# Altium footprint library ic.PcbLib: 114 footprints (part 7 of 8)
Each footprint in its own frame and in the unit in brackets; x right, y up, seen from the top. Pads: shape width x height; smd on the part's side, far side on the other; paste and mask are expansions set on the pad; w line width, h text height; cw(c..) or ccw(c..) is an arc to the next point about the centre after c.
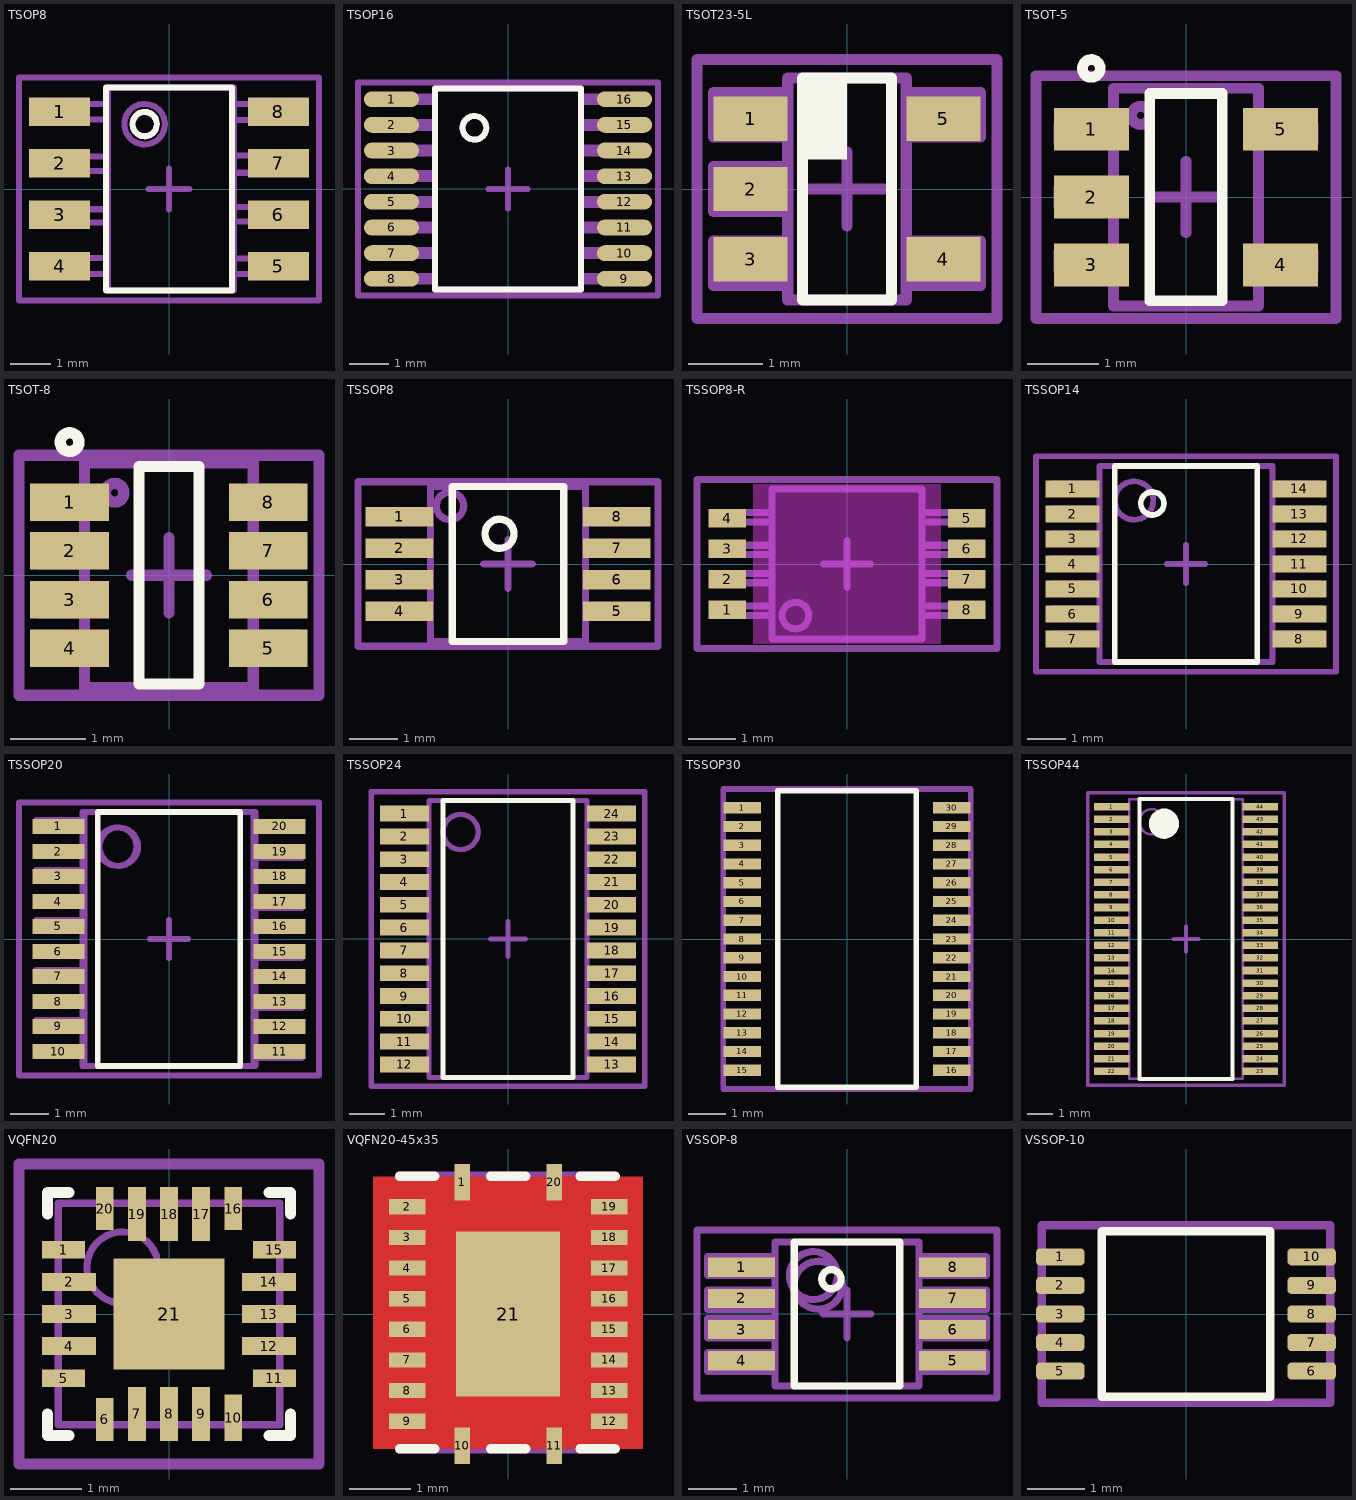
[diagram p6: the footprints below, top view; thin cyan lines are the x and y axes]

## TSOP8 [mm] "8-Lead Plastic Small Outline, Body 4,90x3,85mm, Pitch 1,27mm, IPC Medium Density"
height 1.36
pads (8):
  rect 1.5x0.7 smd: 1(-2.7,1.905) 2(-2.7,0.635) 3(-2.7,-0.635) 4(-2.7,-1.905) 5(2.7,-1.905) 6(2.7,-0.635) 7(2.7,0.635) 8(2.7,1.905)
Top Overlay:
  circle w0.15: c-0.6,1.6 r0.3
  lines w0.15: -1.55,-2.5 1.55,-2.5 1.55,2.5 -1.55,2.5 -1.55,-2.5
  text "." at -2.7,2.8 h0.1
Top Courtyard:
  lines w0.15: -0.5,0 0.5,0 ; 0,-0.5 0,0.5 ; -3.7,-2.75 3.7,-2.75 3.7,2.75 -3.7,2.75 -3.7,-2.75
Mechanical 29:
  circle w0.15: c-0.6,1.6 r0.5
  lines w0.15: -3.3,-2.1 -3.3,-1.7 -1.5,-1.7 -1.5,-2.1 -3.3,-2.1 ; -3.3,-0.83 -3.3,-0.5 -1.5,-0.5 -1.5,-0.83 -3.3,-0.83 ; -3.3,0.44 -3.3,0.8 -1.5,0.8 -1.5,0.44 -3.3,0.44 ; -3.3,1.71 -1.5,1.71 -1.5,2.1 -3.3,2.1 -3.3,1.71 ; -1.5,-2.5 -1.5,2.5 1.6,2.5 1.6,-2.5 -1.5,-2.5 ; 1.6,-2.1 3.3,-2.1 3.3,-1.71 1.6,-1.71 1.6,-2.1 ; 1.6,-0.8 3.3,-0.8 3.3,-0.44 1.6,-0.44 1.6,-0.8 ; 1.6,0.4 3.3,0.4 3.3,0.83 1.6,0.83 1.6,0.4 ; 1.6,1.7 3.3,1.7 3.3,2.1 1.6,2.1 1.6,1.7
  text ".Designator" at -1.3,-0.4 h1

## TSOP16 [mm] "TSOP, 16-Leads, Body 5,00x4,40mm, Pitch 0,65mm, IPC Medium Density"
height 1.2
pads (16):
  oval 1.4x0.4 smd: 1(-2.95,2.275) 2(-2.95,1.625) 3(-2.95,0.975) 4(-2.95,0.325) 5(-2.95,-0.325) 6(-2.95,-0.975) 7(-2.95,-1.625) 8(-2.95,-2.275) 9(2.95,-2.275) 10(2.95,-1.625) 11(2.95,-0.975) 12(2.95,-0.325) 13(2.95,0.325) 14(2.95,0.975) 15(2.95,1.625) 16(2.95,2.275)
Top Overlay:
  circle w0.15: c-0.85,1.55 r0.3
  lines w0.15: -1.85,-2.55 1.85,-2.55 1.85,2.55 -1.85,2.55 -1.85,-2.55
  text "." at -2.9,2.9 h0.1
Top Courtyard:
  lines w0.15: -0.5,0 0.5,0 ; 0,-0.5 0,0.5 ; -3.8,-2.7 3.8,-2.7 3.8,2.7 -3.8,2.7 -3.8,-2.7
Mechanical 29:
  circle w0.15: c-0.85,1.55 r0.3
  lines w0.15: -3.425,-2.35 -3.425,-2.2 -1.85,-2.2 -1.85,-2.35 -3.425,-2.35 ; -3.425,-1.7 -1.85,-1.7 -1.85,-1.55 -3.425,-1.55 -3.425,-1.7 ; -3.425,-1.05 -1.85,-1.05 -1.85,-0.9 -3.425,-0.9 -3.425,-1.05 ; -3.425,-0.4 -1.85,-0.4 -1.85,-0.25 -3.425,-0.25 -3.425,-0.4 ; -3.425,0.25 -1.85,0.25 -1.85,0.4 -3.425,0.4 -3.425,0.25 ; -3.425,0.9 -1.85,0.9 -1.85,1.05 -3.425,1.05 -3.425,0.9 ; -3.425,1.55 -1.85,1.55 -1.85,1.7 -3.425,1.7 -3.425,1.55 ; -3.425,2.2 -1.85,2.2 -1.85,2.35 -3.425,2.35 -3.425,2.2 ; -1.85,-2.55 -1.85,2.55 1.85,2.55 1.85,-2.55 -1.85,-2.55 ; 1.85,-2.35 3.425,-2.35 3.425,-2.2 1.85,-2.2 1.85,-2.35 ; 1.85,-1.7 3.425,-1.7 3.425,-1.55 1.85,-1.55 1.85,-1.7 ; 1.85,-1.05 3.425,-1.05 3.425,-0.9 1.85,-0.9 1.85,-1.05 ; 1.85,-0.4 3.425,-0.4 3.425,-0.25 1.85,-0.25 1.85,-0.4 ; 1.85,0.25 3.425,0.25 3.425,0.4 1.85,0.4 1.85,0.25 ; 1.85,0.9 3.425,0.9 3.425,1.05 1.85,1.05 1.85,0.9 ; 1.85,1.55 3.425,1.55 3.425,1.7 1.85,1.7 1.85,1.55 ; 1.85,2.2 3.425,2.2 3.425,2.35 1.85,2.35 1.85,2.2
  text ".Designator" at -1.7,-0.4 h1
3D body "User Library-User Library-TSSOP16.step": height 1.1, standoff 0, extent -3.19,-2.5 3.21,2.5

## TSOT23-5L [mm] "SOT23, 5-Leads, Body 2,95x2,65mm, Pitch 0,95mm, IPC Medium Density"
height 1.1
pads (5):
  rect 1x0.6 smd: 1(-1.3,0.95) 2(-1.3,0) 3(-1.3,-0.95) 4(1.3,-0.95) 5(1.3,0.95)
Top Overlay:
  rectangle: -0.6,0.4 0,1.5
  lines w0.15: -0.6,-1.5 -0.6,1.5 0.6,1.5 0.6,-1.5 -0.6,-1.5
  text "." at -1.3,1.7 h0.1
Top Courtyard:
  lines w0.15: -0.5,0 0.5,0 ; 0,-0.5 0,0.5 ; -2.025,-1.75 2.025,-1.75 2.025,1.75 -2.025,1.75 -2.025,-1.75
Mechanical 13:
  lines w0.15: -0.8,-1.5 0.8,-1.5 0.8,1.5 -0.8,1.5 -0.8,-1.5
Mechanical 29:
  lines w0.15: -0.8,-1.3 -1.8,-1.3 -1.8,-0.7 -0.8,-0.7 ; -0.8,-0.3 -1.8,-0.3 -1.8,0.3 -0.8,0.3 ; -0.8,0.7 -1.8,0.7 -1.8,1.3 -0.8,1.3 ; 0.8,-1.3 1.8,-1.3 1.8,-0.7 0.8,-0.7 ; 0.8,0.7 1.8,0.7 1.8,1.3 0.8,1.3 ; -0.8,-1.5 -0.8,1.5 0.8,1.5 0.8,-1.5 -0.8,-1.5
  text ".Designator" at -1.9,1.9 h1
3D body "TSOT23-5L  .step": height 1.1, standoff 0, extent -1.4,-1.5 1.4,1.5

## TSOT-5 [mm]
height 1
pads (5):
  rect 1.05x0.6 smd: 1(-1.325,0.95) 2(-1.325,0) 3(-1.325,-0.95) 4(1.325,-0.95) 5(1.325,0.95)
Top Overlay:
  circle w0.15: c-1.325,1.8 r0.125
  lines w0.15: -0.508,-1.45 -0.508,1.45 0.508,1.45 0.508,-1.45 -0.508,-1.45
Top Courtyard:
  lines w0.15: -0.5,0 0.5,0 ; 0,-0.5 0,0.5 ; -2.1,-1.7 -2.1,1.7 2.1,1.7 2.1,-1.7 -2.1,-1.7
Mechanical 29:
  circle w0.15: c-0.635,1.143 r0.127
  lines w0.15: -1.016,-1.016 -1.778,-1.016 -1.778,-0.762 -1.016,-0.762 ; -1.016,-0.127 -1.778,-0.127 -1.778,0.127 -1.016,0.127 ; -1.016,0 -1.016,0.254 ; 1.016,-1.016 1.778,-1.016 1.778,-0.762 1.016,-0.762 ; -1.778,0.762 -1.778,1.016 -1.016,1.016 -1.016,0.762 -1.778,0.762 ; -1.016,-1.524 -1.016,1.524 1.016,1.524 1.016,-1.524 -1.016,-1.524 ; 1.016,0.762 1.016,1.016 1.778,1.016 1.778,0.762 1.016,0.762
  text ".Designator" at -1.9,1.8 h1

## TSOT-8 [mm] "TSOT, 8-Leads, Body 2,90x1,60mm, Pitch 0,65mm, IPC Medium Density"
height 1
pads (8):
  rect 1.05x0.5 smd: 1(-1.325,0.975) 2(-1.325,0.325) 3(-1.325,-0.325) 4(-1.325,-0.975) 5(1.325,-0.975) 6(1.325,-0.325) 7(1.325,0.325) 8(1.325,0.975)
Top Overlay:
  circle w0.15: c-1.325,1.775 r0.125
  lines w0.15: -0.4,-1.45 0.4,-1.45 0.4,1.45 -0.4,1.45 -0.4,-1.45
Top Courtyard:
  lines w0.15: -0.5,0 0.5,0 ; 0,-0.5 0,0.5 ; -2,-1.6 2,-1.6 2,1.6 -2,1.6 -2,-1.6
Mechanical 29:
  circle w0.15: c-0.725,1.1 r0.125
  lines w0.15: -1.725,-1.15 -1.125,-1.15 -1.125,-0.85 -1.725,-0.85 -1.725,-1.15 ; -1.725,-0.5 -1.125,-0.5 -1.125,-0.2 -1.725,-0.2 -1.725,-0.5 ; -1.725,0.15 -1.125,0.15 -1.125,0.45 -1.725,0.45 -1.725,0.15 ; -1.725,0.8 -1.125,0.8 -1.125,1.1 -1.725,1.1 -1.725,0.8 ; -1.125,-1.5 -1.125,1.5 1.125,1.5 1.125,-1.5 -1.125,-1.5 ; 1.125,-1.1 1.725,-1.1 1.725,-0.8 1.125,-0.8 1.125,-1.1 ; 1.125,-0.45 1.725,-0.45 1.725,-0.15 1.125,-0.15 1.125,-0.45 ; 1.125,0.2 1.725,0.2 1.725,0.5 1.125,0.5 1.125,0.2 ; 1.125,0.85 1.125,1.15 1.725,1.15 1.725,0.85 1.125,0.85
  text ".Designator" at -1.9,1.8 h1

## TSSOP8 [mm]
height 1.1
pads (8):
  rect 1.4x0.4 smd: 1(-2.25,0.975) 2(-2.25,0.325) 3(-2.25,-0.325) 4(-2.25,-0.975) 5(2.25,-0.975) 6(2.25,-0.325) 7(2.25,0.325) 8(2.25,0.975)
Top Overlay:
  circle w0.15: c-0.175,0.625 r0.3
  lines w0.15: -1.15,-1.6 1.15,-1.6 1.15,1.6 -1.15,1.6 -1.15,-1.6
  text "." at -2.3,1.7 h0.1
Top Courtyard:
  lines w0.15: -0.5,0 0.5,0 ; 0,-0.5 0,0.5 ; -3.1,-1.7 -3.1,1.7 3.1,1.7 3.1,-1.7 -3.1,-1.7
Mechanical 29:
  circle w0.15: c-1.2,1.2 r0.283
  lines w0.15: -2.6,-1.1 -2.6,-0.9 -1.6,-0.9 -1.6,-1.1 -2.6,-1.1 ; -2.6,-0.4 -2.6,-0.2 -1.6,-0.2 -1.6,-0.4 -2.6,-0.4 ; -2.6,0.2 -2.6,0.4 -1.6,0.4 -1.6,0.2 -2.6,0.2 ; -2.6,0.9 -1.6,0.9 -1.6,1.1 -2.6,1.1 -2.6,0.9 ; -1.6,-1.6 -1.6,1.6 1.6,1.6 1.6,-1.6 -1.6,-1.6 ; 1.6,-1.1 2.6,-1.1 2.6,-0.9 1.6,-0.9 1.6,-1.1 ; 1.6,-0.4 2.6,-0.4 2.6,-0.2 1.6,-0.2 1.6,-0.4 ; 1.6,0.2 2.6,0.2 2.6,0.4 1.6,0.4 1.6,0.2 ; 1.6,0.9 2.6,0.9 2.6,1.1 1.6,1.1 1.6,0.9
  text ".Designator" at -1.3,-0.7 h2
3D body "tssop8.STEP": height 0.9, standoff 0, extent -2.528,-1.6 2.528,1.6

## TSSOP8-R [mm]
height 1.1
pads (8):
  rect 0.8x0.4 smd: 1(-2.55,-0.975) 2(-2.55,-0.325) 3(-2.55,0.325) 4(-2.55,0.975) 5(2.55,0.975) 6(2.55,0.325) 7(2.55,-0.325) 8(2.55,-0.975)
Top Overlay:
  text "." at -2.6,-1.6 h0.1
Keep-Out Layer:
  board cut-out: -2,1.7 2,1.7 2,-1.7 -2,-1.7
Top Courtyard:
  lines w0.15: -0.5,0 0.5,0 ; 0,-0.5 0,0.5 ; -3.2,-1.8 -3.2,1.8 3.2,1.8 3.2,-1.8 -3.2,-1.8
Mechanical 29:
  circle w0.15: c-1.1,-1.1 r0.283
  lines w0.15: -2.6,-1.1 -2.6,-0.9 -1.6,-0.9 -1.6,-1.1 -2.6,-1.1 ; -2.6,-0.4 -2.6,-0.2 -1.6,-0.2 -1.6,-0.4 -2.6,-0.4 ; -2.6,0.2 -2.6,0.4 -1.6,0.4 -1.6,0.2 -2.6,0.2 ; -2.6,0.9 -1.6,0.9 -1.6,1.1 -2.6,1.1 -2.6,0.9 ; -1.6,-1.6 -1.6,1.6 1.6,1.6 1.6,-1.6 -1.6,-1.6 ; 1.6,-1.1 2.6,-1.1 2.6,-0.9 1.6,-0.9 1.6,-1.1 ; 1.6,-0.4 2.6,-0.4 2.6,-0.2 1.6,-0.2 1.6,-0.4 ; 1.6,0.2 2.6,0.2 2.6,0.4 1.6,0.4 1.6,0.2 ; 1.6,0.9 2.6,0.9 2.6,1.1 1.6,1.1 1.6,0.9
  text ".Designator" at -1.4,-0.4 h1
3D body "tssop8.STEP": height 0.25, standoff -0.65, extent -2.528,-1.6 2.528,1.6

## TSSOP14 [mm] "TSOP, 14-Leads, Body 5,00x4,40mm, Pitch 0,65mm, IPC Medium Density"
height 1.1
pads (14):
  rect 1.4x0.45 smd: 1(-2.95,1.95) 2(-2.95,1.3) 3(-2.95,0.65) 4(-2.95,0) 5(-2.95,-0.65) 6(-2.95,-1.3) 7(-2.95,-1.95) 8(2.95,-1.95) 9(2.95,-1.3) 10(2.95,-0.65) 11(2.95,0) 12(2.95,0.65) 13(2.95,1.3) 14(2.95,1.95)
Top Overlay:
  circle w0.15: c-0.875,1.575 r0.3
  lines w0.15: -1.85,-2.55 -1.85,2.55 1.85,2.55 1.85,-2.55 -1.85,-2.55
  text "." at -3.05,2.622 h0.1
Top Courtyard:
  lines w0.15: -0.5,0 0.5,0 ; 0,-0.5 0,0.5 ; -3.9,-2.8 -3.9,2.8 3.9,2.8 3.9,-2.8 -3.9,-2.8
Mechanical 29:
  circle w0.15: c-1.35,1.65 r0.5
  lines w0.15: -2.25,-2 -3.5,-2 -3.5,-1.8 -2.25,-1.8 ; -2.25,-1.35 -3.5,-1.35 -3.5,-1.15 -2.25,-1.15 ; -2.25,-0.7 -3.5,-0.7 -3.5,-0.5 -2.25,-0.5 ; -2.25,-0.05 -3.5,-0.05 -3.5,0.15 -2.25,0.15 ; -2.25,0.6 -3.5,0.6 -3.5,0.8 -2.25,0.8 ; -2.25,1.25 -3.5,1.25 -3.5,1.45 -2.25,1.45 ; -2.25,1.9 -3.5,1.9 -3.5,2.1 -2.25,2.1 ; 2.25,-2 3.5,-2 3.5,-1.8 2.25,-1.8 ; 2.25,-1.35 3.5,-1.35 3.5,-1.15 2.25,-1.15 ; 2.25,-0.7 3.5,-0.7 3.5,-0.5 2.25,-0.5 ; 2.25,-0.05 3.5,-0.05 3.5,0.15 2.25,0.15 ; 2.25,0.6 3.5,0.6 3.5,0.8 2.25,0.8 ; 2.25,1.25 3.5,1.25 3.5,1.45 2.25,1.45 ; 2.25,1.9 3.5,1.9 3.5,2.1 2.25,2.1 ; -2.25,-2.55 -2.25,2.55 2.25,2.55 2.25,-2.55 -2.25,-2.55
  text ".Designator" at -3,3.1 h1

## TSSOP20 [mm] "TSSOP, 20-Leads, Body 6,50x4,40mm, Pitch 0,65mm, IPC Medium Density"
height 1.2
pads (20):
  rect 1.35x0.4 smd: 1(-2.875,2.925) 2(-2.875,2.275) 3(-2.875,1.625) 4(-2.875,0.975) 5(-2.875,0.325) 6(-2.875,-0.325) 7(-2.875,-0.975) 8(-2.875,-1.625) 9(-2.875,-2.275) 10(-2.875,-2.925) 11(2.875,-2.925) 12(2.875,-2.275) 13(2.875,-1.625) 14(2.875,-0.975) 15(2.875,-0.325) 16(2.875,0.325) 17(2.875,0.975) 18(2.875,1.625) 19(2.875,2.275) 20(2.875,2.925)
Top Overlay:
  lines w0.15: -1.85,-3.3 1.85,-3.3 1.85,3.3 -1.85,3.3 -1.85,-3.3
  text "." at -2.9,3.6 h0.1
Top Courtyard:
  lines w0.15: -0.5,0 0.5,0 ; 0,-0.5 0,0.5 ; -3.9,-3.55 3.9,-3.55 3.9,3.55 -3.9,3.55 -3.9,-3.55
Mechanical 13:
  circle w0.15: c-1.35,2.4 r0.5
  lines w0.15: -2.25,-3.3 2.25,-3.3 2.25,3.3 -2.25,3.3 -2.25,-3.3
Mechanical 29:
  circle w0.15: c-1.3,2.4 r0.5
  lines w0.15: -2.2,-3 -3.45,-3 -3.45,-2.8 -2.2,-2.8 ; -2.2,-2.3 -3.45,-2.3 -3.45,-2.1 -2.2,-2.1 ; -2.2,-1.7 -3.45,-1.7 -3.45,-1.5 -2.2,-1.5 ; -2.2,-1 -3.45,-1 -3.45,-0.8 -2.2,-0.8 ; -2.2,-0.4 -3.45,-0.4 -3.45,-0.2 -2.2,-0.2 ; -2.2,0.3 -3.45,0.3 -3.45,0.5 -2.2,0.5 ; -2.2,0.9 -3.45,0.9 -3.45,1.1 -2.2,1.1 ; -2.2,1.6 -3.45,1.6 -3.45,1.8 -2.2,1.8 ; -2.2,2.2 -3.45,2.2 -3.45,2.4 -2.2,2.4 ; -2.2,2.9 -3.45,2.9 -3.45,3.1 -2.2,3.1 ; 2.2,-3.1 3.45,-3.1 3.45,-2.9 2.2,-2.9 ; 2.2,-2.4 3.45,-2.4 3.45,-2.2 2.2,-2.2 ; 2.2,-1.8 3.45,-1.8 3.45,-1.6 2.2,-1.6 ; 2.2,-1.1 3.45,-1.1 3.45,-0.9 2.2,-0.9 ; 2.2,-0.5 3.45,-0.5 3.45,-0.3 2.2,-0.3 ; 2.2,0.2 3.45,0.2 3.45,0.4 2.2,0.4 ; 2.2,0.8 3.45,0.8 3.45,1 2.2,1 ; 2.2,1.5 3.45,1.5 3.45,1.7 2.2,1.7 ; 2.2,2.1 3.45,2.1 3.45,2.3 2.2,2.3 ; 2.2,2.8 3.45,2.8 3.45,3 2.2,3 ; -2.2,-3.3 2.2,-3.3 2.2,3.3 -2.2,3.3 -2.2,-3.3
  text ".Designator" at -3.3,3.6 h1
3D body "TSSOP-20.step": height 1.2, standoff 0, extent -3.2,-3.3 3.2,3.3

## TSSOP24 [mm] "TSOP, 24-Leads, Body 7,80x4,40mm, Pitch 0,65mm, IPC Medium Density"
height 1.1
pads (24):
  rect 1.4x0.45 smd: 1(-2.95,3.575) 2(-2.95,2.925) 3(-2.95,2.275) 4(-2.95,1.625) 5(-2.95,0.975) 6(-2.95,0.325) 7(-2.95,-0.325) 8(-2.95,-0.975) 9(-2.95,-1.625) 10(-2.95,-2.275) 11(-2.95,-2.925) 12(-2.95,-3.575) 13(2.95,-3.575) 14(2.95,-2.925) 15(2.95,-2.275) 16(2.95,-1.625) 17(2.95,-0.975) 18(2.95,-0.325) 19(2.95,0.325) 20(2.95,0.975) 21(2.95,1.625) 22(2.95,2.275) 23(2.95,2.925) 24(2.95,3.575)
Top Overlay:
  lines w0.15: -1.85,-3.95 1.85,-3.95 1.85,3.95 -1.85,3.95 -1.85,-3.95
  text "." at -3,4.3 h0.1
Top Courtyard:
  lines w0.15: -0.5,0 0.5,0 ; 0,-0.5 0,0.5 ; -3.9,-4.2 3.9,-4.2 3.9,4.2 -3.9,4.2 -3.9,-4.2
Mechanical 29:
  circle w0.15: c-1.35,3.05 r0.5
  lines w0.15: -2.25,-3.7 -3.5,-3.7 -3.5,-3.5 -2.25,-3.5 ; -2.25,-3 -3.5,-3 -3.5,-2.8 -2.25,-2.8 ; -2.25,-2.4 -3.5,-2.4 -3.5,-2.2 -2.25,-2.2 ; -2.25,-1.7 -3.5,-1.7 -3.5,-1.5 -2.25,-1.5 ; -2.25,-1.1 -3.5,-1.1 -3.5,-0.9 -2.25,-0.9 ; -2.25,-0.4 -3.5,-0.4 -3.5,-0.2 -2.25,-0.2 ; -2.25,0.2 -3.5,0.2 -3.5,0.4 -2.25,0.4 ; -2.25,0.9 -3.5,0.9 -3.5,1.1 -2.25,1.1 ; -2.25,1.5 -3.5,1.5 -3.5,1.7 -2.25,1.7 ; -2.25,2.2 -3.5,2.2 -3.5,2.4 -2.25,2.4 ; -2.25,2.8 -3.5,2.8 -3.5,3 -2.25,3 ; -2.25,3.5 -3.5,3.5 -3.5,3.7 -2.25,3.7 ; 2.25,-3.7 3.5,-3.7 3.5,-3.5 2.25,-3.5 ; 2.25,-3 3.5,-3 3.5,-2.8 2.25,-2.8 ; 2.25,-2.4 3.5,-2.4 3.5,-2.2 2.25,-2.2 ; 2.25,-1.7 3.5,-1.7 3.5,-1.5 2.25,-1.5 ; 2.25,-1.1 3.5,-1.1 3.5,-0.9 2.25,-0.9 ; 2.25,-0.4 3.5,-0.4 3.5,-0.2 2.25,-0.2 ; 2.25,0.2 3.5,0.2 3.5,0.4 2.25,0.4 ; 2.25,0.9 3.5,0.9 3.5,1.1 2.25,1.1 ; 2.25,1.5 3.5,1.5 3.5,1.7 2.25,1.7 ; 2.25,2.2 3.5,2.2 3.5,2.4 2.25,2.4 ; 2.25,2.8 3.5,2.8 3.5,3 2.25,3 ; 2.25,3.5 3.5,3.5 3.5,3.7 2.25,3.7 ; -2.25,-3.95 2.25,-3.95 2.25,3.95 -2.25,3.95 -2.25,-3.95
  text ".Designator" at -2,-0.4 h1

## TSSOP30 [mm] "TSSOP, 30-Leads, Body 7,80x4,40mm, Pitch 0,50mm, IPC Medium Density"
height 1.2
pads (30):
  rect 1x0.3 smd: 1(-2.8,3.5) 2(-2.8,3) 3(-2.8,2.5) 4(-2.8,2) 5(-2.8,1.5) 6(-2.8,1) 7(-2.8,0.5) 8(-2.8,0) 9(-2.8,-0.5) 10(-2.8,-1) 11(-2.8,-1.5) 12(-2.8,-2) 13(-2.8,-2.5) 14(-2.8,-3) 15(-2.8,-3.5) 16(2.8,-3.5) 17(2.8,-3) 18(2.8,-2.5) 19(2.8,-2) 20(2.8,-1.5) 21(2.8,-1) 22(2.8,-0.5) 23(2.8,0) 24(2.8,0.5) 25(2.8,1) 26(2.8,1.5) 27(2.8,2) 28(2.8,2.5) 29(2.8,3) 30(2.8,3.5)
Top Overlay:
  lines w0.15: -1.85,-3.95 1.85,-3.95 1.85,3.95 -1.85,3.95 -1.85,-3.95
  text "." at -2.955,4.159 h0.1
Top Courtyard:
  lines w0.15: -3.3,-4 3.3,-4 3.3,4 -3.3,4 -3.3,-4
3D body "TSSOP30.step": height 1.2, standoff 0, extent -3.2,-3.95 3.2,3.95

## TSSOP44 [mm] "TSSOP, 44-Leads, Body 11,00x4,40mm, Pitch 0,50mm, IPC Medium Density"
height 1.2
pads (44):
  rect 1.4x0.3 smd: 1(-2.95,5.25) 2(-2.95,4.75) 3(-2.95,4.25) 4(-2.95,3.75) 5(-2.95,3.25) 6(-2.95,2.75) 7(-2.95,2.25) 8(-2.95,1.75) 9(-2.95,1.25) 10(-2.95,0.75) 11(-2.95,0.25) 12(-2.95,-0.25) 13(-2.95,-0.75) 14(-2.95,-1.25) 15(-2.95,-1.75) 16(-2.95,-2.25) 17(-2.95,-2.75) 18(-2.95,-3.25) 19(-2.95,-3.75) 20(-2.95,-4.25) 21(-2.95,-4.75) 22(-2.95,-5.25) 23(2.95,-5.25) 24(2.95,-4.75) 25(2.95,-4.25) 26(2.95,-3.75) 27(2.95,-3.25) 28(2.95,-2.75) 29(2.95,-2.25) 30(2.95,-1.75) 31(2.95,-1.25) 32(2.95,-0.75) 33(2.95,-0.25) 34(2.95,0.25) 35(2.95,0.75) 36(2.95,1.25) 37(2.95,1.75) 38(2.95,2.25) 39(2.95,2.75) 40(2.95,3.25) 41(2.95,3.75) 42(2.95,4.25) 43(2.95,4.75) 44(2.95,5.25)
Top Overlay:
  circle w0.6: c-0.875,4.575 r0.3
  lines w0.15: -1.85,-5.55 1.85,-5.55 1.85,5.55 -1.85,5.55 -1.85,-5.55
  text "." at -3,5.9 h0.1
Top Courtyard:
  circle w0.1: c-1.35,4.65 r0.5
  lines w0.1: -2.25,-5.55 2.25,-5.55 2.25,5.55 -2.25,5.55 -2.25,-5.55
  lines w0.15: -0.5,0 0.5,0 ; 0,-0.5 0,0.5 ; -3.9,-5.8 -3.9,5.8 3.9,5.8 3.9,-5.8 -3.9,-5.8
3D body "TSSOP44.step": height 1.2, standoff 0, extent -3.2,-5.55 3.2,5.55

## VQFN20 [mm] "VQFN, 20-Leads, Body 3,00x3,00mm, Pitch 0,45mm, Thermal Pad 1,55x1,55mm, IPC Medium Density"
height 0.85
pads (21):
  rect 0.6x0.25 smd: 1(-1.475,0.9) 5(-1.475,-0.9) 11(1.475,-0.9) 15(1.475,0.9)
  rect 0.75x0.25 smd: 2(-1.4,0.45) 3(-1.4,0) 4(-1.4,-0.45) 12(1.4,-0.45) 13(1.4,0) 14(1.4,0.45)
  rect 0.25x0.6 smd: 6(-0.9,-1.475) 16(0.9,1.475) 20(-0.9,1.475)
  rect 0.25x0.75 smd: 7(-0.45,-1.4) 8(0,-1.4) 9(0.45,-1.4) 17(0.45,1.4) 18(0,1.4) 19(-0.45,1.4)
  rect 0.25x0.65 smd: 10(0.9,-1.45)
  rect 1.55x1.55 smd: 21(0,0)
Top Overlay:
  lines w0.15: -1.7,-1.4 -1.7,-1.7 -1.4,-1.7 ; -1.7,1.4 -1.7,1.7 -1.4,1.7 ; 1.4,-1.7 1.7,-1.7 1.7,-1.4 ; 1.4,1.7 1.7,1.7 1.7,1.4
  text "." at -2.355,1.559 h0.1
Top Courtyard:
  circle w0.1: c-0.65,0.65 r0.5
  lines w0.1: -1.55,-1.55 -1.55,1.55 1.55,1.55 1.55,-1.55 -1.55,-1.55
  lines w0.15: -0.5,0 0.5,0 ; 0,-0.5 0,0.5 ; -2.1,-2.1 2.1,-2.1 2.1,2.1 -2.1,2.1 -2.1,-2.1
3D body "VQFN20.step": height 0.85, standoff 0, extent -1.57,-1.57 1.57,1.57

## VQFN20-45x35 [mm] "VQFN, 20-Leads, Body 3,00x3,00mm, Pitch 0,45mm, Thermal Pad 1,55x1,55mm, IPC Medium Density"
height 0.85
pads (21):
  rect 0.25x0.6 smd: 1(-0.75,2.15) 10(-0.75,-2.15) 11(0.75,-2.15) 20(0.75,2.15)
  rect 0.6x0.25 smd: 2(-1.65,1.75) 3(-1.65,1.25) 4(-1.65,0.75) 5(-1.65,0.25) 6(-1.65,-0.25) 7(-1.65,-0.75) 8(-1.65,-1.25) 9(-1.65,-1.75) 12(1.65,-1.75) 13(1.65,-1.25) 14(1.65,-0.75) 15(1.65,-0.25) 16(1.65,0.25) 17(1.65,0.75) 18(1.65,1.25) 19(1.65,1.75)
  rect 1.7x2.7 smd: 21(0,0)
Top Layer:
  pour cut-out: 2.201,-2.2 2.201,2.242 -2.207,2.242 -2.207,-2.2
Top Overlay:
  lines w0.15: -1.775,-2.2 -1.2,-2.2 ; -1.775,2.25 -1.2,2.25 ; -0.288,-2.2 0.288,-2.2 ; -0.288,2.25 0.288,2.25 ; 1.175,-2.2 1.75,-2.2 ; 1.175,2.25 1.75,2.25
  text "." at -1.524,2.705 h0.1
Top Courtyard:
  lines w0.15: -0.5,0 0.5,0 ; 0,-0.5 0,0.5 ; -1.775,-2.2 -1.775,2.25 1.75,2.25 1.75,-2.2 -1.775,-2.2
3D body "RGY0020B.stp": height 1, standoff 0, extent -1.75,-2.25 1.75,2.25

## VSSOP-8 [mm] "TSOP, 8-Leads, Body 3,00x3,00mm, Pitch 0,65mm, IPC Medium Density"
height 1.1
pads (8):
  rect 1.4x0.4 smd: 1(-2.2,0.975) 2(-2.2,0.325) 3(-2.2,-0.325) 4(-2.2,-0.975) 5(2.2,-0.975) 6(2.2,-0.325) 7(2.2,0.325) 8(2.2,0.975)
Top Overlay:
  circle w0.15: c-0.325,0.725 r0.2
  lines w0.15: -1.1,-1.5 1.1,-1.5 1.1,1.5 -1.1,1.5 -1.1,-1.5
  text "." at -2.2,1.7 h0.1
Top Courtyard:
  lines w0.15: -0.5,0 0.5,0 ; 0,-0.5 0,0.5 ; -3.125,-1.75 3.125,-1.75 3.125,1.75 -3.125,1.75 -3.125,-1.75
Mechanical 13:
  circle w0.15: c-0.6,0.6 r0.5
  lines w0.15: -1.5,-1.5 1.5,-1.5 1.5,1.5 -1.5,1.5 -1.5,-1.5
Mechanical 29:
  circle w0.15: c-0.7,0.8 r0.5
  lines w0.15: -1.5,-1.2 -2.9,-1.2 -2.9,-0.8 -1.5,-0.8 ; -1.5,-0.5 -2.9,-0.5 -2.9,-0.1 -1.5,-0.1 ; -1.5,0.1 -2.9,0.1 -2.9,0.5 -1.5,0.5 ; -1.5,0.8 -2.9,0.8 -2.9,1.2 -1.5,1.2 ; 1.5,-1.2 2.9,-1.2 2.9,-0.8 1.5,-0.8 ; 1.5,-0.5 2.9,-0.5 2.9,-0.1 1.5,-0.1 ; 1.5,0.1 2.9,0.1 2.9,0.5 1.5,0.5 ; 1.5,0.8 2.9,0.8 2.9,1.2 1.5,1.2 ; -1.5,-1.5 -1.5,1.5 1.5,1.5 1.5,-1.5 -1.5,-1.5
  text ".Designator" at -2.7,2 h1
3D body "VSSOP-8.step": height 1.1, standoff 0, extent -2.45,-1.5 2.45,1.5

## VSSOP-10 [mm] "VSSOP, 10-Leads, Body 3,00x3,00mm, Pitch 0,50mm, IPC High Density"
height 1.1
pads (10):
  rrect50% 0.85x0.3 smd: 1(-2.2,1) 2(-2.2,0.5) 3(-2.2,0) 4(-2.2,-0.5) 5(-2.2,-1) 6(2.2,-1) 7(2.2,-0.5) 8(2.2,0) 9(2.2,0.5) 10(2.2,1)
Top Overlay:
  lines w0.15: -1.475,-1.45 -1.475,1.45 1.475,1.45 1.475,-1.45 -1.475,-1.45
  text "." at -2.255,1.759 h0.1
Top Courtyard:
  lines w0.15: -2.525,-1.55 -2.525,1.55 2.525,1.55 2.525,-1.55 -2.525,-1.55
3D body "VSSOP-10.step": height 1.1, standoff 0, extent -2.45,-1.55 2.45,1.55